# Altium footprint library PCB_Module.PcbLib: 23 footprints (part 1 of 2)
Each footprint in its own frame and in the unit in brackets; x right, y up, seen from the top. Pads: shape width x height; smd on the part's side, far side on the other; paste and mask are expansions set on the pad; w line width, h text height; cw(c..) or ccw(c..) is an arc to the next point about the centre after c.
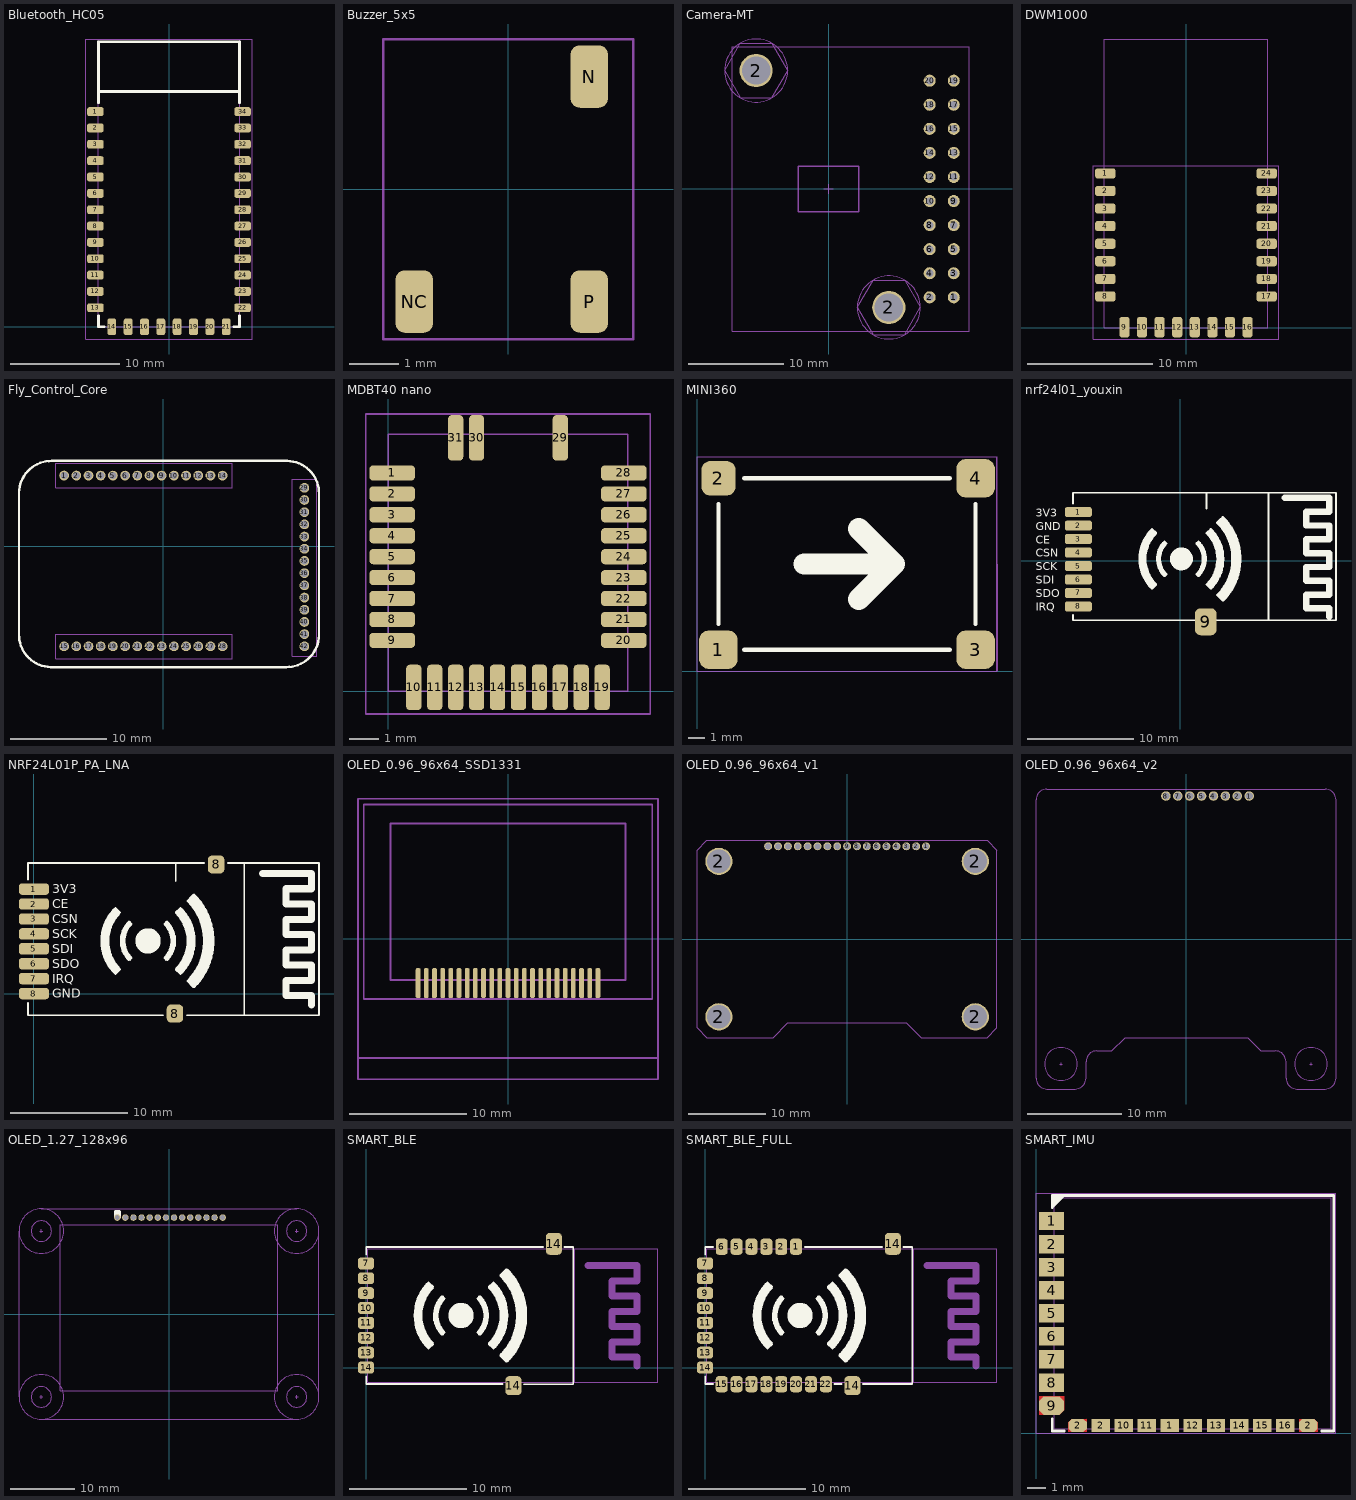
[diagram p0: the footprints below, top view; thin cyan lines are the x and y axes]

## Bluetooth_HC05 [mil]
pads (34):
  rrect50% 60x32 smd: 1(-265.91,777.56) 2(-265.91,718.5) 3(-265.91,659.45) 4(-265.91,600.39) 5(-265.91,541.34) 6(-265.91,482.28) 7(-265.91,423.23) 8(-265.91,364.17) 9(-265.91,305.12) 10(-265.91,246.06) 11(-265.91,187.01) 12(-265.91,127.95) 13(-265.91,68.9) 22(265.91,68.9) 23(265.91,127.95) 24(265.91,187.01) 25(265.91,246.06) 26(265.91,305.12) 27(265.91,364.17) 28(265.91,423.23) 29(265.91,482.28) 30(265.91,541.34) 31(265.91,600.39) 32(265.91,659.45) 33(265.91,718.5) 34(265.91,777.56)
  rrect50% 32x60 smd: 14(-206.69,0) 15(-147.64,0) 16(-88.58,0) 17(-29.53,0) 18(29.53,0) 19(88.58,0) 20(147.64,0) 21(206.69,0)
Top Overlay:
  lines w10: -255,40 -255,0 -235,0 ; -255,810 -255,850 ; 235,0 255,0 255,40 ; 255,810 255,850 ; -255,850 255,850 ; -255,850 -255,1030 255,1030 255,850
Mechanical 13:
  lines w2: -255.91,850.39 255.91,850.39 ; -255.91,0 -255.91,1039.37 255.91,1039.37 255.91,0 -255.91,0
T-Component:
  lines w2: -300,-44 -300,1040 300,1040 300,-44 -300,-44
3D body "User Library-Bluetooth HC-06_.STEP": height 92.52, standoff 0, extent -275.98,0 275.98,1102.76

## Buzzer_5x5 [mil]
pads (3):
  rrect50% 30x50 smd: N(65,90) NC(-75,-90) P(65,-90)
T-Component:
  lines w2: -100,-120 100,-120 100,120 -100,120 -100,-120
3D body "css-0575b-smt.stp": height 106.3, standoff 0, extent -98.44,-98.43 98.41,98.43

## Camera-MT [mil]
pads (22):
  round 50 hole 31: 1(520,-450) 2(420,-450) 3(520,-350) 4(420,-350) 5(520,-250) 6(420,-250) 7(520,-150) 8(420,-150) 9(520,-50) 10(420,-50) 11(520,50) 12(420,50) 13(520,150) 14(420,150) 15(520,250) 16(420,250) 17(520,350) 18(420,350) 19(520,450) 20(420,450)
  round 137.8 hole 118.11 mask+0: 2(-300.94,492.13) 2(250.24,-492.13)
Mechanical 13:
  circle w2: c250.24,-492.13 r130.98
  circle w2: c-300.94,492.13 r130.98
  lines w2: -19.69,0 19.68,0 ; 0,-19.69 0,19.68 ; -431.92,492.13 -366.43,378.7 -235.46,378.7 -169.97,492.12 -235.46,605.55 -366.43,605.55 -431.92,492.13 ; -399.37,-590.55 584.88,-590.55 584.88,590.55 -399.37,590.55 -399.37,-590.55 ; 119.26,-492.13 184.75,-605.56 315.72,-605.56 381.21,-492.13 315.72,-378.7 184.75,-378.7 119.26,-492.13
  lines w6: -126,-94 -126,94 126,94 126,-94 -126,-94
B-Component:
  lines w1: 510,-450 530,-450 ; 510,-350 530,-350 ; 510,-250 530,-250 ; 510,-150 530,-150 ; 510,-50 530,-50 ; 510,50 530,50 ; 510,150 530,150 ; 510,250 530,250 ; 510,350 530,350 ; 510,450 530,450 ; 520,-460 520,-440 ; 520,-360 520,-340 ; 520,-260 520,-240 ; 520,-160 520,-140 ; 520,-60 520,-40 ; 520,40 520,60 ; 520,140 520,160 ; 520,240 520,260 ; 520,340 520,360 ; 520,440 520,460
3D body "female_header_a-bl254-dg-g04d.stp": height 334.65, standoff -125.98, extent 371.57,-504.91 568.42,-295.07
3D body "female_header_a-bl254-dg-g06d.stp": height 334.65, standoff -125.98, extent 371.57,-304.92 568.42,4.93
3D body "female_header_a-bl254-dg-g06d.stp": height 334.65, standoff -125.98, extent 371.57,195.08 568.42,504.93
3D body "female_header_a-bl254-dg-g04d.stp": height 334.65, standoff -125.98, extent 371.57,-4.91 568.42,204.93
3D body "Camera-MT__Pcb.step": height 528.82, standoff 114.65, extent -399.36,-590.55 584.89,590.55

## DWM1000 [mil]
pads (24):
  rrect50% 64x32 smd: 1(-253,484.25) 2(-253,429.13) 3(-253,374.02) 4(-253,318.9) 5(-253,263.78) 6(-253,208.66) 7(-253,153.54) 8(-253,98.43) 17(253,98.43) 18(253,153.54) 19(253,208.66) 20(253,263.78) 21(253,318.9) 22(253,374.02) 23(253,429.13) 24(253,484.25)
  rrect50% 32x64 smd: 9(-192.91,2) 10(-137.8,2) 11(-82.68,2) 12(-27.56,2) 13(27.56,2) 14(82.68,2) 15(137.8,2) 16(192.91,2)
Mechanical 13:
  lines w1.97: -255.91,905.51 -255.91,0 255.91,0 255.91,905.51
  lines w2: -255.91,905.51 255.91,905.51
T-Component:
  lines w2: -290,-35 -290,508 290,508 290,-35 -290,-35
3D body "DWM1000 Module.STEP": height 114.17, standoff -0.39, extent -255.9,0 255.9,905.51

## Fly_Control_Core [mil]
height 50
pads (42):
  round 40 hole 30: 1(-406.44,288.88) 2(-356.44,288.88) 3(-306.44,288.88) 4(-256.44,288.88) 5(-206.44,288.88) 6(-156.44,288.88) 7(-106.44,288.88) 8(-56.44,288.88) 9(-6.44,288.88) 10(43.56,288.88) 11(93.56,288.88) 12(143.56,288.88) 13(193.56,288.88) 14(243.56,288.88) 15(-406.44,-411.11) 16(-356.44,-411.11) 17(-306.44,-411.11) 18(-256.44,-411.11) 19(-206.44,-411.12) 20(-156.44,-411.12) 21(-106.44,-411.12) 22(-56.44,-411.12) 23(-6.44,-411.12) 24(43.56,-411.12) 25(93.56,-411.12) 26(143.56,-411.12) 27(193.56,-411.12) 28(243.56,-411.12) 29(578.56,238.88) 30(578.56,188.88) 31(578.56,138.88) 32(578.56,88.88) 33(578.56,38.88) 34(578.56,-11.12) 35(578.55,-61.12) 36(578.55,-111.12) 37(578.55,-161.12) 38(578.55,-211.12) 39(578.55,-261.12) 40(578.55,-311.12) 41(578.55,-361.12) 42(578.55,-411.12)
Top Overlay:
  lines w10: 638.56,-366.12 cw(c506.06,-363.62) 503.56,-496.12 -461.44,-496.12 cw(c-458.94,-363.62) -591.44,-361.12 -591.44,218.88 cw(c-458.94,216.38) -456.44,348.88 478.56,348.88 508.56,348.88 cw(c506.06,216.38) 638.56,213.88 638.56,-361.12
Mechanical 13:
  lines w2: -441.44,-461.11 283.56,-461.11 283.56,-361.11 -441.44,-361.11 -441.44,-461.11 ; -441.44,238.88 283.56,238.88 283.56,338.88 -441.44,338.88 -441.44,238.88 ; 528.56,-451.12 628.56,-451.12 628.56,273.88 528.56,273.88 528.56,-451.12
T-Component:
  lines w2: -441.44,-461.11 -441.44,-361.11 283.56,-361.11 283.56,-461.11 -441.44,-461.11 ; -441.44,238.88 -441.44,338.88 283.56,338.88 283.56,238.88 -441.44,238.88 ; 528.56,-451.12 528.56,273.88 628.56,273.88 628.56,-451.12 528.56,-451.12
3D body "飞控PCB.step": height 184.37, standoff 52.3, extent -597.54,-502.32 642.46,352.68
3D body "pin_header_a-sl127-eg-g14d.stp": height 197.36, standoff -115.24, extent -429.36,240.89 270.64,339.32
3D body "pin_header_a-sl127-eg-g14d.stp": height 197.36, standoff -115.24, extent 528.26,-438.05 626.69,261.95
3D body "pin_header_a-sl127-eg-g14d.stp": height 197.36, standoff -115.24, extent -430.41,-461.58 269.59,-363.16

## MDBT40 nano [mil]
pads (31):
  rrect50% 60x20 smd: 1(5,287.4) 2(5,259.84) 3(5,232.28) 4(5,204.72) 5(5,177.17) 6(5,149.61) 7(5,122.05) 8(5,94.49) 9(5,66.93) 20(310,66.93) 21(310,94.49) 22(310,122.05) 23(310,149.61) 24(310,177.17) 25(310,204.72) 26(310,232.28) 27(310,259.84) 28(310,287.4)
  rrect50% 20x60 smd: 10(33.46,5) 11(61.02,5) 12(88.58,5) 13(116.14,5) 14(143.7,5) 15(171.26,5) 16(198.82,5) 17(226.38,5) 18(253.94,5) 19(281.5,5) 29(226.38,333.58) 30(116.14,333.58) 31(88.58,333.58)
Mechanical 13:
  lines w2: 0,0 314.96,0 314.96,338.58 0,338.58 0,0
T-Component:
  lines w2: -30,-30 -30,365 345,365 345,-30 -30,-30

## MINI360 [mil]
pads (4):
  rrect50% 90x90 smd: 1(50,50) 3(650,50) 4(650,450)
  rrect50% 80x80 smd: 2(50,450)
Top Overlay:
  lines w10: 50,110 50,390 ; 110,50 590,50 ; 110,450 590,450 ; 650,110 650,390
  lines w50: 250,250 460,250 ; 377.5,167.5 460,250 ; 377.5,332.5 460,250
Mechanical 13:
  lines w2: 0,0 0,500 700,500 700,0 0,0
T-Component:
  lines w2: 0,0 0,500 700,500 700,0 0,0

## nrf24l01_youxin [mil]
pads (9):
  rrect50% 100x38 smd: 1(-377.57,180.39) 2(-377.57,130.39) 3(-377.57,80.39) 4(-377.57,30.39) 5(-377.57,-19.61) 6(-377.57,-69.61) 7(-377.57,-119.61) 8(-377.57,-169.61)
  rrect50% 80x100 smd: 9(94.68,-226.31)
Top Overlay:
  circle w45: c4.43,6.8 r20
  lines w6: -397.57,-201.1 -397.57,-220.68 55.5,-220.68 ; -397.57,212.28 -397.57,251.97 272.12,251.97 ; 97.27,192.05 97.27,252.05 ; 134.24,-220.68 577.43,-220.68 ; 272.03,251.97 577.43,251.97 ; 327.35,-218.72 327.35,251.58 ; 577.43,-218.72 577.43,251.09
  lines w10: -111.07,-95.7 -104.57,-102.2 -90.57,-88.2 -95.57,-83.2 ; -110.57,109.8 -104.57,115.8 -90.57,101.8 -95.57,96.8 ; -63.57,-51.2 -58.57,-56.2 -52.57,-50.2 -57.57,-45.2 ; -63.57,64.8 -58.57,69.8 -52.57,63.8 -57.57,58.8 ; 66.43,-45.2 61.43,-50.2 67.43,-56.2 72.43,-51.2 ; 66.43,58.8 61.43,63.8 67.43,69.8 72.43,64.8 ; 104.43,-83.2 99.43,-88.2 113.43,-102.2 119.43,-96.2 ; 104.43,96.8 99.43,101.8 113.43,115.8 119.93,109.3 ; 147.93,-117.7 138.43,-127.2 157.93,-146.7 167.43,-137.2 ; 148.43,130.8 138.43,140.8 157.93,160.3 166.93,151.3
  lines w19: -58.99,-49.58 cw(c4.43,6.8) -58.94,63.23 ; 67.79,-49.64 ccw(c4.43,6.8) 67.85,63.17
  lines w23.62: 387.43,232.8 551.84,232.8 551.84,181.62 467.43,181.62 467.43,130.43 551.84,130.43 551.84,79.25 467.43,79.25 467.43,28.07 551.84,28.07 551.84,-23.11 467.43,-23.11 467.43,-74.29 551.84,-74.29 551.84,-125.47 467.43,-125.47 467.43,-176.65 551.84,-176.65 551.84,-207.2
  lines w30: -104.81,-87.41 cw(c4.43,6.8) -104.81,101 ; 113.67,-87.41 ccw(c4.43,6.8) 113.67,101
  lines w38: 157.99,-126.95 ccw(c4.43,6.8) 157.99,140.55
  text "CE" at -534.79,63.83 h30
  text "3V3" at -534.79,163.42 h30
  text "CSN" at -534.79,13.83 h30
  text "SCK" at -534.79,-36.17 h30
  text "SDI" at -534.79,-86.17 h30
  text "SDO" at -534.79,-136.17 h30
  text "IRQ" at -534.79,-186.17 h30
  text "GND" at -534.79,113.91 h30
3D body "RF.step": height 46.5, standoff -0.8, extent -383.05,-235.05 581.95,264.95

## NRF24L01P_PA_LNA [mil]
pads (10):
  rrect50% 100x38 smd: 1(0,350) 2(0,300) 3(0,250) 4(0,200) 5(0,150) 6(0,100) 7(0,50) 8(0,0)
  rrect50% 55x60 smd: 8(472.44,-66.93) 8(610.24,432.68)
Top Overlay:
  circle w45: c382,176.4 r20
  lines w6: -20,-31.5 -20,-72.6 433.07,-72.6 ; -20,381.89 -20,437.4 570.87,437.4 ; 474.84,377.4 474.84,437.4 ; 511.81,-72.6 955,-72.6 955,437.4 649.61,437.4 ; 704.92,-72.6 704.92,437.4
  lines w10: 266.5,73.9 273,67.4 287,81.4 282,86.4 ; 267,279.4 273,285.4 287,271.4 282,266.4 ; 314,118.4 319,113.4 325,119.4 320,124.4 ; 314,234.4 319,239.4 325,233.4 320,228.4 ; 444,124.4 439,119.4 445,113.4 450,118.4 ; 444,228.4 439,233.4 445,239.4 450,234.4 ; 482,86.4 477,81.4 491,67.4 497,73.4 ; 482,266.4 477,271.4 491,285.4 497.5,278.9 ; 525.5,51.9 516,42.4 535.5,22.9 545,32.4 ; 526,300.4 516,310.4 535.5,329.9 544.5,320.9
  lines w19: 318.58,120.03 cw(c382,176.4) 318.63,232.84 ; 445.37,119.97 ccw(c382,176.4) 445.42,232.77
  lines w23.62: 765,402.4 929.41,402.4 929.41,351.22 845,351.22 845,300.04 929.41,300.04 929.41,248.86 845,248.86 845,197.68 929.41,197.68 929.41,146.5 845,146.5 845,95.31 929.41,95.31 929.41,44.13 845,44.13 845,-7.05 929.41,-7.05 929.41,-37.6
  lines w30: 272.76,82.2 cw(c382,176.4) 272.76,270.61 ; 491.24,82.2 ccw(c382,176.4) 491.24,270.61
  lines w38: 535.57,42.65 ccw(c382,176.4) 535.57,310.15
  text "CE" at 61,285.4 h30
  text "3V3" at 61,335.4 h30
  text "CSN" at 61,235.4 h30
  text "SCK" at 61,185.4 h30
  text "SDI" at 61,135.4 h30
  text "SDO" at 61,85.4 h30
  text "IRQ" at 61,35.4 h30
  text "GND" at 61,-14.6 h30
3D body "RF.step": height 46.5, standoff -0.8, extent -15,-67.6 950,432.4

## OLED_0.96_96x64_SSD1331 [mil]
pads (23):
  rrect50% 16x100 smd: 1(303.15,-150) 2(275.59,-150) 3(248.03,-150) 4(220.47,-150) 5(192.91,-150) 6(165.35,-150) 7(137.8,-150) 8(110.24,-150) 9(82.68,-150) 10(55.12,-150) 11(27.56,-150) 12(0,-150) 13(-27.56,-150) 14(-55.12,-150) 15(-82.68,-150) 16(-110.24,-150) 17(-137.8,-150) 18(-165.35,-150) 19(-192.91,-150) 20(-220.47,-150) 21(-248.03,-150) 22(-275.59,-150) 23(-303.15,-150)
Mechanical 13:
  lines w6: -505.91,-402.4 -505.91,-474.45 505.91,-474.45 505.91,-402.4 ; -505.91,-402.4 -505.91,471.61 505.91,471.61 505.91,-402.4 ; -505.91,-402.4 505.91,-402.4 ; -486.22,-203.58 -486.22,451.93 486.22,451.93 486.22,-203.58 -486.22,-203.58 ; -396.46,-140 396.46,-140 396.46,388.35 -396.46,388.35 -396.46,-140
3D body "User Library-096OLED.STEP": height 24.42, standoff -126.58, extent -525.58,-398.28 525.6,476.38

## OLED_0.96_96x64_v1 [mil]
pads (21):
  round 40 hole 30: 1(400.45,469.72) 2(350.45,469.72) 3(300.45,469.72) 4(250.45,469.72) 5(200.45,469.72) 6(150.45,469.72) 7(100.45,469.72) 8(50.45,469.72) 9(0.45,469.72) 10(-49.55,469.72) 11(-99.55,469.72) 12(-149.55,469.72) 13(-199.55,469.72) 14(-249.55,469.73) 15(-299.55,469.73) 16(-349.55,469.73) 17(-399.55,469.73)
  round 137.8 hole 118.11 mask+0: 2(-649.15,-393.98) 2(-649.15,393.43) 2(650.06,-393.98) 2(650.06,393.43)
Mechanical 13:
  lines w2: -760,-449.82 -760,450.18 -710,500.18 710,500.18 760,450.18 760,-449.82 710,-499.82 375,-499.82 300.45,-425.27 -299.55,-425.27 -374.09,-499.82 -710,-499.82 -760,-449.82

## OLED_0.96_96x64_v2 [mil]
pads (8):
  round 40 hole 30: 1(265.45,600.55) 2(215.45,600.55) 3(165.45,600.55) 4(115.45,600.55) 5(65.45,600.55) 6(15.45,600.55) 7(-34.55,600.55) 8(-84.55,600.55)
Mechanical 13:
  circle w2: c-525,-525 r69
  circle w2: c525,-525 r69
  lines w2: -530,-525 -520,-525 ; -525,-530 -525,-520 ; 520,-525 530,-525 ; 525,-530 525,-520 ; -630,-585 ccw(c-585,-585) -585,-630 -465,-630 ccw(c-465,-585) -420,-585 -420,-515 cw(c-375,-515) -375,-470 -310.91,-470 -255.45,-414.55 259.55,-414.55 315,-470 375,-470 cw(c375,-515) 420,-515 420,-585 ccw(c465,-585) 465,-630 585,-630 ccw(c585,-585) 630,-585 630,585 ccw(c585,585) 585,630 -585,630 ccw(c-585,585) -630,585 -630,-585
3D body "female_header_a-bl127-eg-z08d.stp": height 133.86, standoff -94.49, extent -117.43,565.11 298.32,635.98

## OLED_1.27_128x96 [mil]
pads (14):
  round 40 hole 30: 1(-319.09,594.69) 2(-269.09,594.69) 3(-219.09,594.69) 4(-169.09,594.69) 5(-119.09,594.69) 6(-69.09,594.69) 7(-19.09,594.69) 8(30.91,594.69) 9(80.91,594.69) 10(130.91,594.69) 11(180.91,594.69) 12(230.91,594.69) 13(280.91,594.69) 14(330.91,594.69)
Top Overlay:
  region: -299.09,634.69 -299.09,594.69 -304.09,594.69 -304.38,597.61 -306.62,603.02 -310.76,607.16 -316.17,609.4 -319.09,609.69 -322.02,609.4 -327.43,607.16 -331.57,603.02 -333.81,597.61 -334.09,594.69 -339.1,594.69 -339.1,634.68 -334.09,639.69 -304.09,639.69
Bottom Overlay:
  region: -299.09,634.69 -299.09,594.69 -304.09,594.69 -304.38,597.61 -306.62,603.02 -310.76,607.16 -316.17,609.4 -319.09,609.68 -319.09,609.69 -322.02,609.4 -327.43,607.16 -331.57,603.02 -333.81,597.61 -334.09,594.69 -339.1,594.69 -339.1,634.68 -334.09,639.69 -304.09,639.69
Mechanical 13:
  circle w2: c-787.4,-511.81 r63
  circle w2: c787.4,-511.81 r63
  circle w2: c787.4,511.81 r63
  circle w2: c-787.4,511.81 r63
  circle w2: c-787.4,511.81 r137.8
  circle w2: c-787.4,-511.81 r137.8
  circle w2: c787.4,-511.81 r137.8
  circle w2: c787.4,511.81 r137.8
  lines w2: -797.4,-511.81 -777.4,-511.81 ; -797.4,511.81 -777.4,511.81 ; -787.4,-649.61 cw(c-787.4,-511.81) -925.2,-511.81 ; -787.4,-521.81 -787.4,-501.81 ; -787.4,501.81 -787.4,521.81 ; -787.32,-649.61 787.4,-649.61 ccw(c787.4,-511.81) 925.2,-511.81 925.2,511.81 ccw(c787.4,511.81) 787.4,649.61 -787.4,649.61 ccw(c-787.4,511.81) -925.2,511.81 -925.2,-511.81 ; 777.4,-511.81 797.4,-511.81 ; 777.4,511.81 797.4,511.81 ; 787.4,-521.81 787.4,-501.81 ; 787.4,501.81 787.4,521.81 ; -925.2,-511.81 -925.2,-511.81 ; -669.29,-472.44 -669.29,551.18 669.29,551.18 669.29,-472.44 -669.29,-472.44

## SMART_BLE [mil]
pads (10):
  rrect50% 54x40 smd: 7(0,350) 8(0,300) 9(0,250) 10(0,200) 11(0,150) 12(0,100) 13(0,50) 14(0,0)
  rrect50% 54x64 smd: 14(495,-61)
  rrect50% 54x74 smd: 14(631,416)
Top Overlay:
  circle w45: c319,175 r20
  lines w6: 1,-29 1,-55 459,-55 ; 1,379 1,405 595,405 ; 531,-56 696,-56 696,405 667,405
  lines w10: 203.5,72.5 210,66 224,80 219,85 ; 204,278 210,284 224,270 219,265 ; 251,117 256,112 262,118 257,123 ; 251,233 256,238 262,232 257,227 ; 381,123 376,118 382,112 387,117 ; 381,227 376,232 382,238 387,233 ; 419,85 414,80 428,66 434,72 ; 419,265 414,270 428,284 434.5,277.5 ; 462.5,50.5 453,41 472.5,21.5 482,31 ; 463,299 453,309 472.5,328.5 482.5,318.5
  lines w19: 255.58,118.63 cw(c319,175) 255.63,231.43 ; 382.37,118.57 ccw(c319,175) 382.42,231.37
  lines w30: 209.76,80.79 cw(c319,175) 209.76,269.21 ; 428.24,80.79 ccw(c319,175) 428.24,269.21
  lines w38: 472.57,41.25 ccw(c319,175) 472.57,308.75
Mechanical 13:
  lines w2: 701,-50 701,400 ; 6,-50 6,400 981,400 981,-50 6,-50
  lines w23.62: 746,342.4 910.41,342.4 910.41,291.22 826,291.22 826,240.04 910.41,240.04 910.41,188.86 826,188.86 826,137.68 910.41,137.68 910.41,86.5 826,86.5 826,35.31 910.41,35.31 910.41,4.76
3D body "SmartBLE_Pcb.step": height 60.16, standoff 3.8, extent 6,-50 981,400

## SMART_BLE_FULL [mil]
pads (24):
  rrect50% 40x54 smd: 1(306,406) 2(256,406) 3(206,406) 4(156,406) 5(106,406) 6(56,406) 15(56,-56) 16(106,-56) 17(156,-56) 18(206,-56) 19(256,-56) 20(306,-56) 21(356,-56) 22(406,-56)
  rrect50% 54x40 smd: 7(0,350) 8(0,300) 9(0,250) 10(0,200) 11(0,150) 12(0,100) 13(0,50) 14(0,0)
  rrect50% 54x64 smd: 14(495,-61)
  rrect50% 54x74 smd: 14(631,416)
Top Overlay:
  circle w45: c319,175 r20
  lines w6: 1,-29 1,-55 27,-55 ; 1,379 1,405 27,405 ; 335,405 595,405 ; 435,-55 459,-55 ; 531,-55 696,-55 696,405 667,405
  lines w10: 203.5,72.5 210,66 224,80 219,85 ; 204,278 210,284 224,270 219,265 ; 251,117 256,112 262,118 257,123 ; 251,233 256,238 262,232 257,227 ; 381,123 376,118 382,112 387,117 ; 381,227 376,232 382,238 387,233 ; 419,85 414,80 428,66 434,72 ; 419,265 414,270 428,284 434.5,277.5 ; 462.5,50.5 453,41 472.5,21.5 482,31 ; 463,299 453,309 472.5,328.5 482.5,318.5
  lines w19: 255.58,118.63 cw(c319,175) 255.63,231.43 ; 382.37,118.57 ccw(c319,175) 382.42,231.37
  lines w30: 209.76,80.79 cw(c319,175) 209.76,269.21 ; 428.24,80.79 ccw(c319,175) 428.24,269.21
  lines w38: 472.57,41.25 ccw(c319,175) 472.57,308.75
Mechanical 13:
  lines w2: 701,-50 701,400 ; 6,-50 981,-50 981,400 6,400 6,-50
  lines w23.62: 746,342.4 910.41,342.4 910.41,291.22 826,291.22 826,240.04 910.41,240.04 910.41,188.86 826,188.86 826,137.68 910.41,137.68 910.41,86.5 826,86.5 826,35.31 910.41,35.31 910.41,4.76
3D body "SmartBLE_Pcb.step": height 60.16, standoff 3.8, extent 6,-50 981,400

## SMART_IMU [mil]
pads (20):
  rect 54x40 smd: 1(34,460) 2(34,410) 3(34,360) 4(34,310) 5(34,260) 6(34,210) 7(34,160) 8(34,110)
  rect 40x28 smd: 1(290,17) 2(140,17) 10(190,17) 11(240,17) 12(340,17) 13(390,17) 14(440,17) 15(490,17) 16(540,17)
  oct 40x28 smd: 2(90,17) 2(590,17)
  oct 54x40 smd: 9(34,60)
Top Layer:
  region: 570,3 570,31 603,31 610,24 610,3
  region: 7,80 61,80 61,50 51,40 7,40
  region: 110,3 70,3 70,24 77,31 110,31
Top Overlay:
  region: 35,515 61,515 35,489
  lines w6: 35,31 35,5 61,5 ; 61,515 35,489 35,515 645,515 645,5 619,5
Mechanical 13:
  lines w2: 40,10 640,10 640,510 40,510 40,10
T-Component:
  lines w2: 0,0 650,0 650,520 0,520 0,0
3D body "SmartIMU_Pcb.step": height 84.06, standoff -0.4, extent 40,10 640.01,510